# Altium integrated library WE-LAN_rev15b.intlib: 35 symbols
Pins are listed as number, name and electrical type; pins without a type are passive.

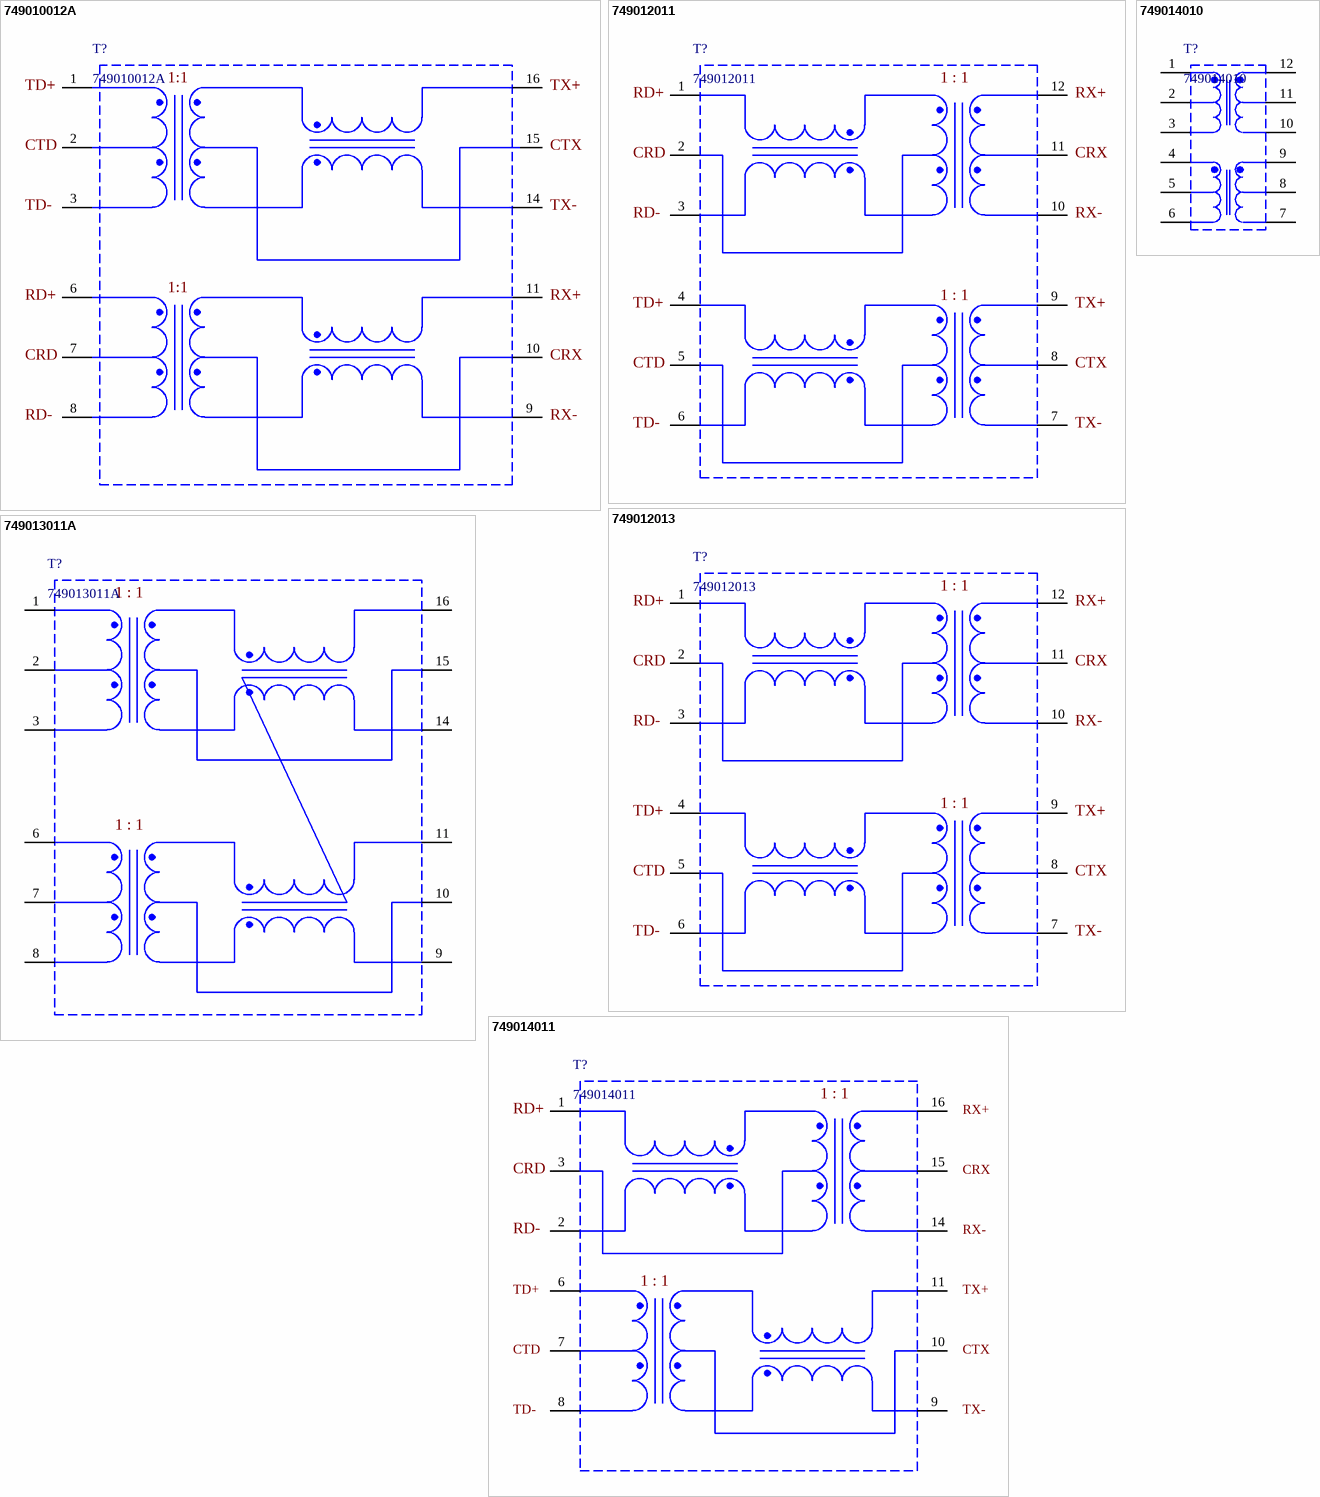
[diagram p0: symbols 749010012A to 749014011]

## 749010012A
designator T?
10/100 Base-T SMD Transformer 1 Port; Manufacturer: Wurth Elektronik; ComponentLink1Description: Manufacturer; ComponentLink1URL: http://www.we-online.com; ComponentLink2Description: Datasheet; ComponentLink2URL: http://katalog.we-online.de/pbs/datasheet/749010012A.pdf; Created by: Baojun Chen; Created Date: 27.Oct.2015; partNo: 749010012A
footprint 749010012A (10/100 Base-T SMD Transformer 1 Port)
pins: 1 TD+, 2 CTD, 3 TD-, 6 RD+, 7 CRD, 8 RD-, 9 RX-, 10 CRX, 11 RX+, 14 TX-, 15 CTX, 16 TX+
text: 1:1

## 749012011
designator T?
10/100/1000 Base-T PoE/PoE+; Manufacturer: Wurth Elektronik; ComponentLink1Description: Manufacturer; ComponentLink1URL: http://www.we-online.com; ComponentLink2Description: Datasheet; ComponentLink2URL: http://katalog.we-online.de/pbs/datasheet/749012011.pdf; Created by: Baojun Chen; Created Date: 28.Oct.2015; partNo: 749012011
footprint 749012011 (10/100/1000 Base-T PoE/PoE+)
pins: 1 RD+, 2 CRD, 3 RD-, 4 TD+, 5 CTD, 6 TD-, 7 TX-, 8 CTX, 9 TX+, 10 RX-, 11 CRX, 12 RX+
text: 1 : 1

## 749012013
designator T?
10/100/1000 Base-T PoE/PoE+; Manufacturer: Wurth Elektronik; ComponentLink1Description: Manufacturer; ComponentLink1URL: http://www.we-online.com; ComponentLink2Description: Datasheet; ComponentLink2URL: http://katalog.we-online.de/pbs/datasheet/749012013.pdf; Created by: Baojun Chen; Created Date: 28.Oct.2015; partNo: 749012013
footprint 749012013 (10/100/1000 Base-T PoE/PoE+)
pins: 1 RD+, 2 CRD, 3 RD-, 4 TD+, 5 CTD, 6 TD-, 7 TX-, 8 CTX, 9 TX+, 10 RX-, 11 CRX, 12 RX+
text: 1 : 1

## 749013011A
designator T?
10/100/1000 Base-T PoE/PoE+; Manufacturer: Wurth Elektronik; ComponentLink1Description: Manufacturer; ComponentLink1URL: http://www.we-online.com; ComponentLink2Description: Datasheet; ComponentLink2URL: http://katalog.we-online.de/pbs/datasheet/749013011A.pdf; Created by: Baojun Chen; Created Date: 28.Oct.2015; partNo: 749013011A
footprint 749013011A (10/100/1000 Base-T PoE/PoE+)
pins: 1, 2, 3, 6, 7, 8, 9, 10, 11, 14, 15, 16
text: 1 : 1

## 749014010
designator T?
10/100/1000 Base-T High Voltage; Manufacturer: Wurth Elektronik; ComponentLink1Description: Manufacturer; ComponentLink1URL: http://www.we-online.com; ComponentLink2Description: Datasheet; ComponentLink2URL: http://katalog.we-online.de/pbs/datasheet/749014010.pdf; Created by: Baojun Chen; Created Date: 28.Oct.2015; partNo: 749014010
footprint 749014010 (10/100/1000 Base-T High Voltage)
pins: 1, 2, 3, 4, 5, 6, 7, 8, 9, 10, 11, 12

## 749014011
designator T?
10/100/1000 Base-T High Voltage; Manufacturer: Wurth Elektronik; ComponentLink1Description: Manufacturer; ComponentLink1URL: http://www.we-online.com; ComponentLink2Description: Datasheet; ComponentLink2URL: http://katalog.we-online.de/pbs/datasheet/749014011.pdf; Created by: Baojun Chen; Created Date: 30.Oct.2015; partNo: 749014011
footprint 749014011 (10/100/1000 Base-T High Voltage)
pins: 1 RD+, 2 RD-, 3 CRD, 6 TD+, 7 CTD, 8 TD-, 9 TX-, 10 CTX, 11 TX+, 14 RX-, 15 CRX, 16 RX+
text: 1 : 1

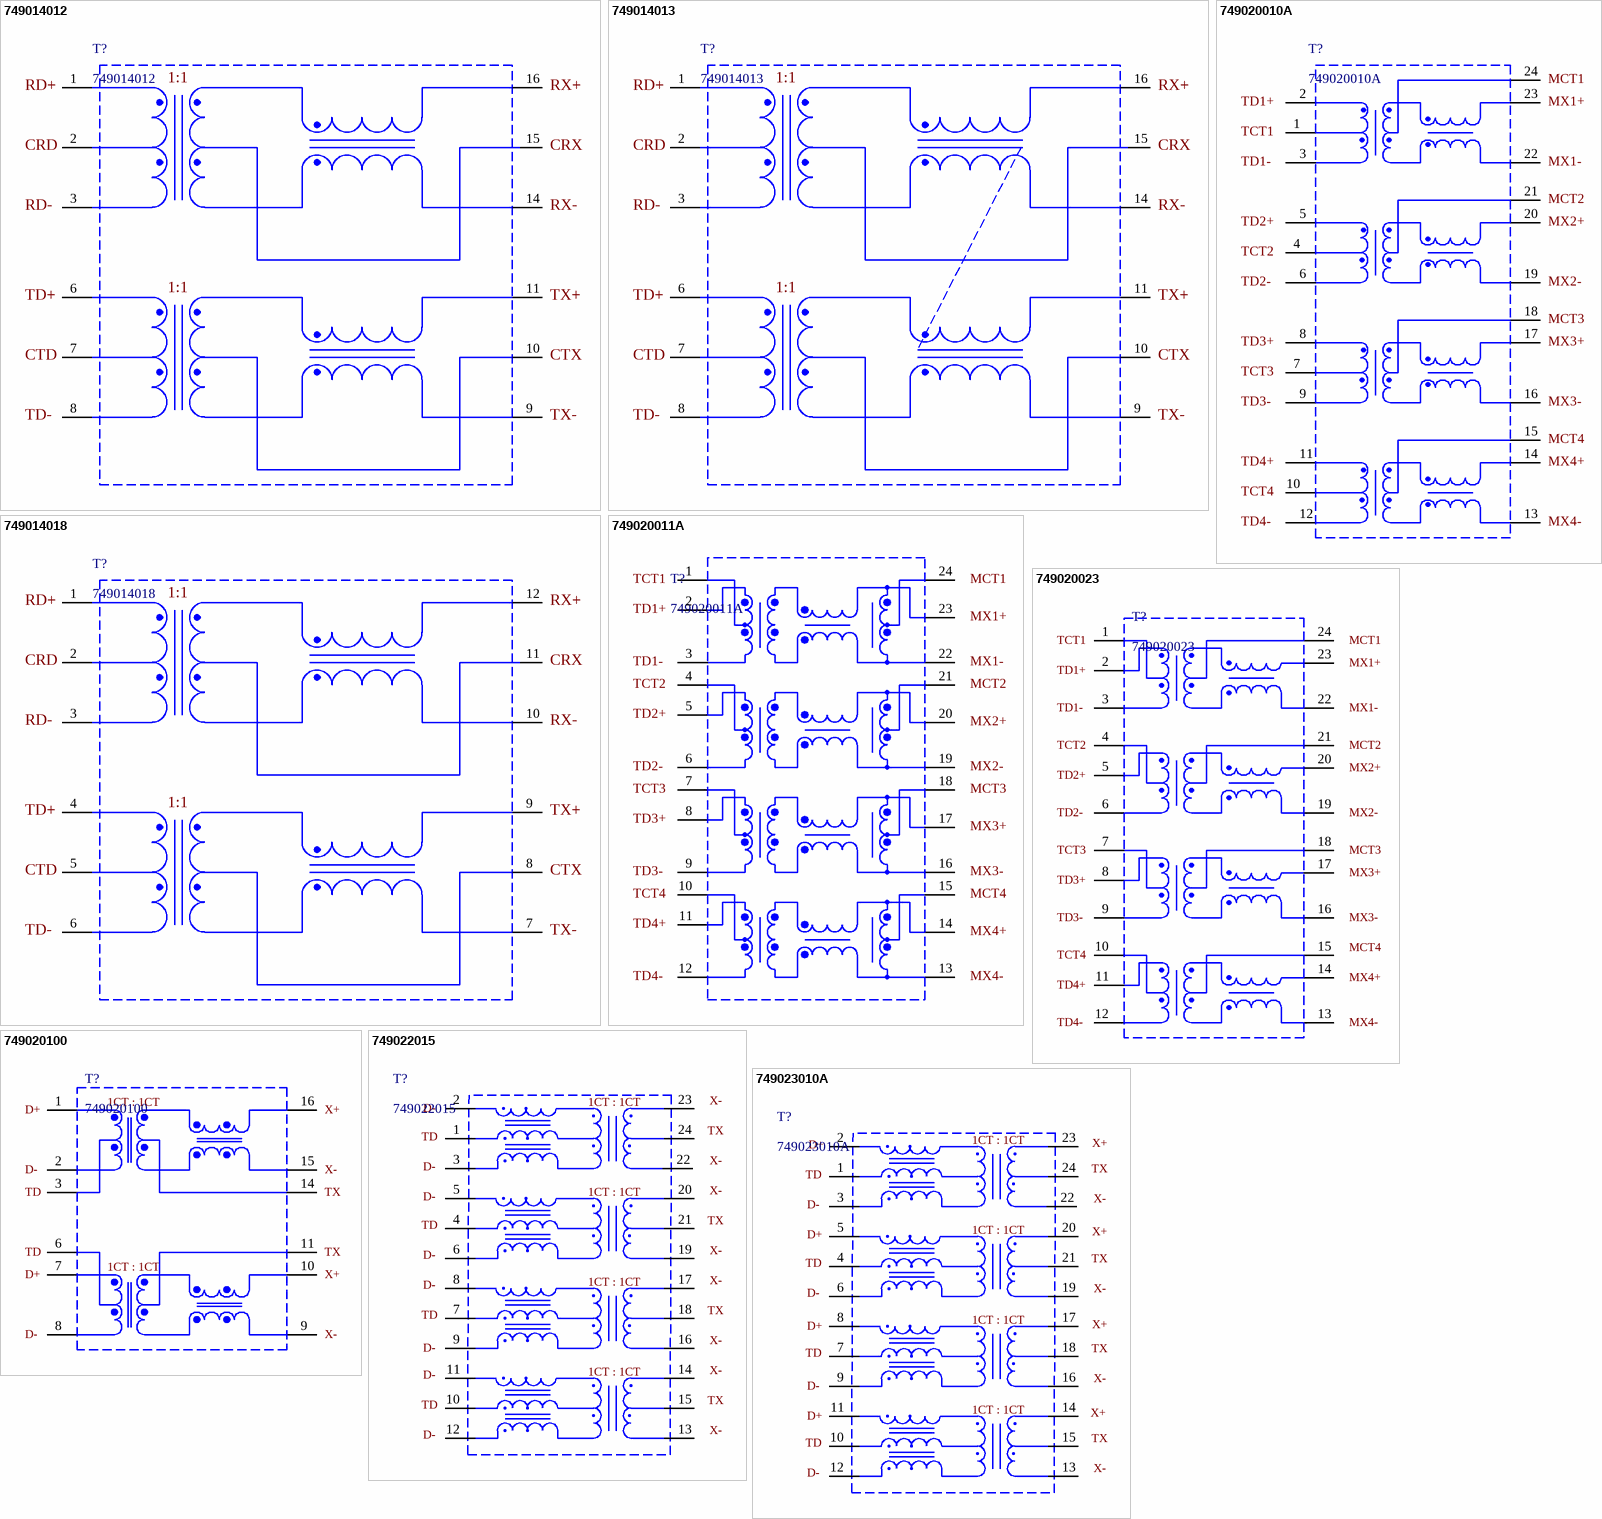
[diagram p1: symbols 749014012 to 749023010A]

## 749014012
designator T?
10/100/1000 Base-T High Voltage; Manufacturer: Wurth Elektronik; ComponentLink1Description: Manufacturer; ComponentLink1URL: http://www.we-online.com; ComponentLink2Description: Datasheet; ComponentLink2URL: http://katalog.we-online.de/pbs/datasheet/749014012.pdf; Created by: Baojun Chen; Created Date: 30.Oct.2015; partNo: 749014012
footprint 749014012 (10/100/1000 Base-T High Voltage)
pins: 1 RD+, 2 CRD, 3 RD-, 6 TD+, 7 CTD, 8 TD-, 9 TX-, 10 CTX, 11 TX+, 14 RX-, 15 CRX, 16 RX+
text: 1:1

## 749014013
designator T?
10/100/1000 Base-T High Voltage; Manufacturer: Wurth Elektronik; ComponentLink1Description: Manufacturer; ComponentLink1URL: http://www.we-online.com; ComponentLink2Description: Datasheet; ComponentLink2URL: http://katalog.we-online.de/pbs/datasheet/749014013.pdf; Created by: Baojun Chen; Created Date: 30.Oct.2015; partNo: 749014013
footprint 749014013 (10/100/1000 Base-T High Voltage)
pins: 1 RD+, 2 CRD, 3 RD-, 6 TD+, 7 CTD, 8 TD-, 9 TX-, 10 CTX, 11 TX+, 14 RX-, 15 CRX, 16 RX+
text: 1:1

## 749014018
designator T?
10/100/1000 Base-T High Voltage; Manufacturer: Wurth Elektronik; ComponentLink1Description: Manufacturer; ComponentLink1URL: http://www.we-online.com; ComponentLink2Description: Datasheet; ComponentLink2URL: http://katalog.we-online.de/pbs/datasheet/749014018.pdf; Created by: Baojun Chen; Created Date: 30.Oct.2015; partNo: 749014018
footprint 749014018 (10/100/1000 Base-T High Voltage)
pins: 1 RD+, 2 CRD, 3 RD-, 4 TD+, 5 CTD, 6 TD-, 7 TX-, 8 CTX, 9 TX+, 10 RX-, 11 CRX, 12 RX+
text: 1:1

## 749020010A
designator T?
10/100/1000 Base-T; Manufacturer: Wurth Elektronik; ComponentLink1Description: Manufacturer; ComponentLink1URL: http://www.we-online.com; ComponentLink2Description: Datasheet; ComponentLink2URL: http://katalog.we-online.de/pbs/datasheet/749020010A.pdf; Created by: Baojun Chen; Created Date: 31.Oct.2015; partNo: 749020010A
footprint 749020010A (10/100/1000 Base-T)
pins: 1 TCT1, 2 TD1+, 3 TD1-, 4 TCT2, 5 TD2+, 6 TD2-, 7 TCT3, 8 TD3+, 9 TD3-, 10 TCT4, 11 TD4+, 12 TD4-, 13 MX4-, 14 MX4+, 15 MCT4, 16 MX3-, 17 MX3+, 18 MCT3, 19 MX2-, 20 MX2+, 21 MCT2, 22 MX1-, 23 MX1+, 24 MCT1

## 749020011A
designator T?
10/100/1000 Base-T; Manufacturer: Wurth Elektronik; ComponentLink1Description: Manufacturer; ComponentLink1URL: http://www.we-online.com; ComponentLink2Description: Datasheet; ComponentLink2URL: http://katalog.we-online.de/pbs/datasheet/749020011A.pdf; Created by: Baojun Chen; Created Date: 31.Oct.2015; partNo: 749020011A
footprint 749020011A (10/100/1000 Base-T)
pins: 1 TCT1, 2 TD1+, 3 TD1-, 4 TCT2, 5 TD2+, 6 TD2-, 7 TCT3, 8 TD3+, 9 TD3-, 10 TCT4, 11 TD4+, 12 TD4-, 13 MX4-, 14 MX4+, 15 MCT4, 16 MX3-, 17 MX3+, 18 MCT3, 19 MX2-, 20 MX2+, 21 MCT2, 22 MX1-, 23 MX1+, 24 MCT1

## 749020023
designator T?
10/100/1000 Base-T; Manufacturer: Wurth Elektronik; ComponentLink1Description: Manufacturer; ComponentLink1URL: http://www.we-online.com; ComponentLink2Description: Datasheet; ComponentLink2URL: http://katalog.we-online.de/pbs/datasheet/749020023.pdf; Created by: Baojun Chen; Created Date: 3.Nov.2015; partNo: 749020023
footprint 749020023 (10/100/1000 Base-T)
pins: 1 TCT1, 2 TD1+, 3 TD1-, 4 TCT2, 5 TD2+, 6 TD2-, 7 TCT3, 8 TD3+, 9 TD3-, 10 TCT4, 11 TD4+, 12 TD4-, 13 MX4-, 14 MX4+, 15 MCT4, 16 MX3-, 17 MX3+, 18 MCT3, 19 MX2-, 20 MX2+, 21 MCT2, 22 MX1-, 23 MX1+, 24 MCT1

## 749020100
designator T?
10/100/1000 Base-T; Manufacturer: Wurth Elektronik; ComponentLink2URL: http://katalog.we-online.de/pbs/datasheet/749020100.pdf; Created by: Baojun Chen; Created Date: 3.Nov.2015; partNo: 749020100; ComponentLink1Description: Manufacturer; ComponentLink1URL: http://www.we-online.com; ComponentLink2Description: Datasheet
footprint 749020100 (10/100/1000 Base-T)
pins: 1 D+, 2 D-, 3 TD, 6 TD, 7 D+, 8 D-, 9 X-, 10 X+, 11 TX, 14 TX, 15 X-, 16 X+
text: 1CT : 1CT

## 749022015
designator T?
10/100/1000 Base-T PoE/PoE+; Manufacturer: Wurth Elektronik; Created by: Baojun Chen; Created Date: 4.Nov..2015; partNo: 749022015; ComponentLink1Description: Manufacturer; ComponentLink1URL: http://www.we-online.com; ComponentLink2Description: Datasheet
footprint 749022015 (10/100/1000 Base-T PoE/PoE+)
pins: 1 TD, 2 D-, 3 D-, 4 TD, 5 D-, 6 D-, 7 TD, 8 D-, 9 D-, 10 TD, 11 D-, 12 D-, 13 X-, 14 X-, 15 TX, 16 X-, 17 X-, 18 TX, 19 X-, 20 X-, 21 TX, 22 X-, 23 X-, 24 TX
text: 1CT : 1CT

## 749023010A
designator T?
10/100/1000 Base-T PoE/PoE+; Manufacturer: Wurth Elektronik; ComponentLink2URL: http://katalog.we-online.de/pbs/datasheet/749023010A.pdf; Created by: Baojun Chen; Created Date: 4.Nov..2015; partNo: 749023010A; ComponentLink1Description: Manufacturer; ComponentLink1URL: http://www.we-online.com; ComponentLink2Description: Datasheet
footprint 749023010A (10/100/1000 Base-T PoE/PoE+)
pins: 1 TD, 2 D+, 3 D-, 4 TD, 5 D+, 6 D-, 7 TD, 8 D+, 9 D-, 10 TD, 11 D+, 12 D-, 13 X-, 14 X+, 15 TX, 16 X-, 17 X+, 18 TX, 19 X-, 20 X+, 21 TX, 22 X-, 23 X+, 24 TX
text: 1CT : 1CT

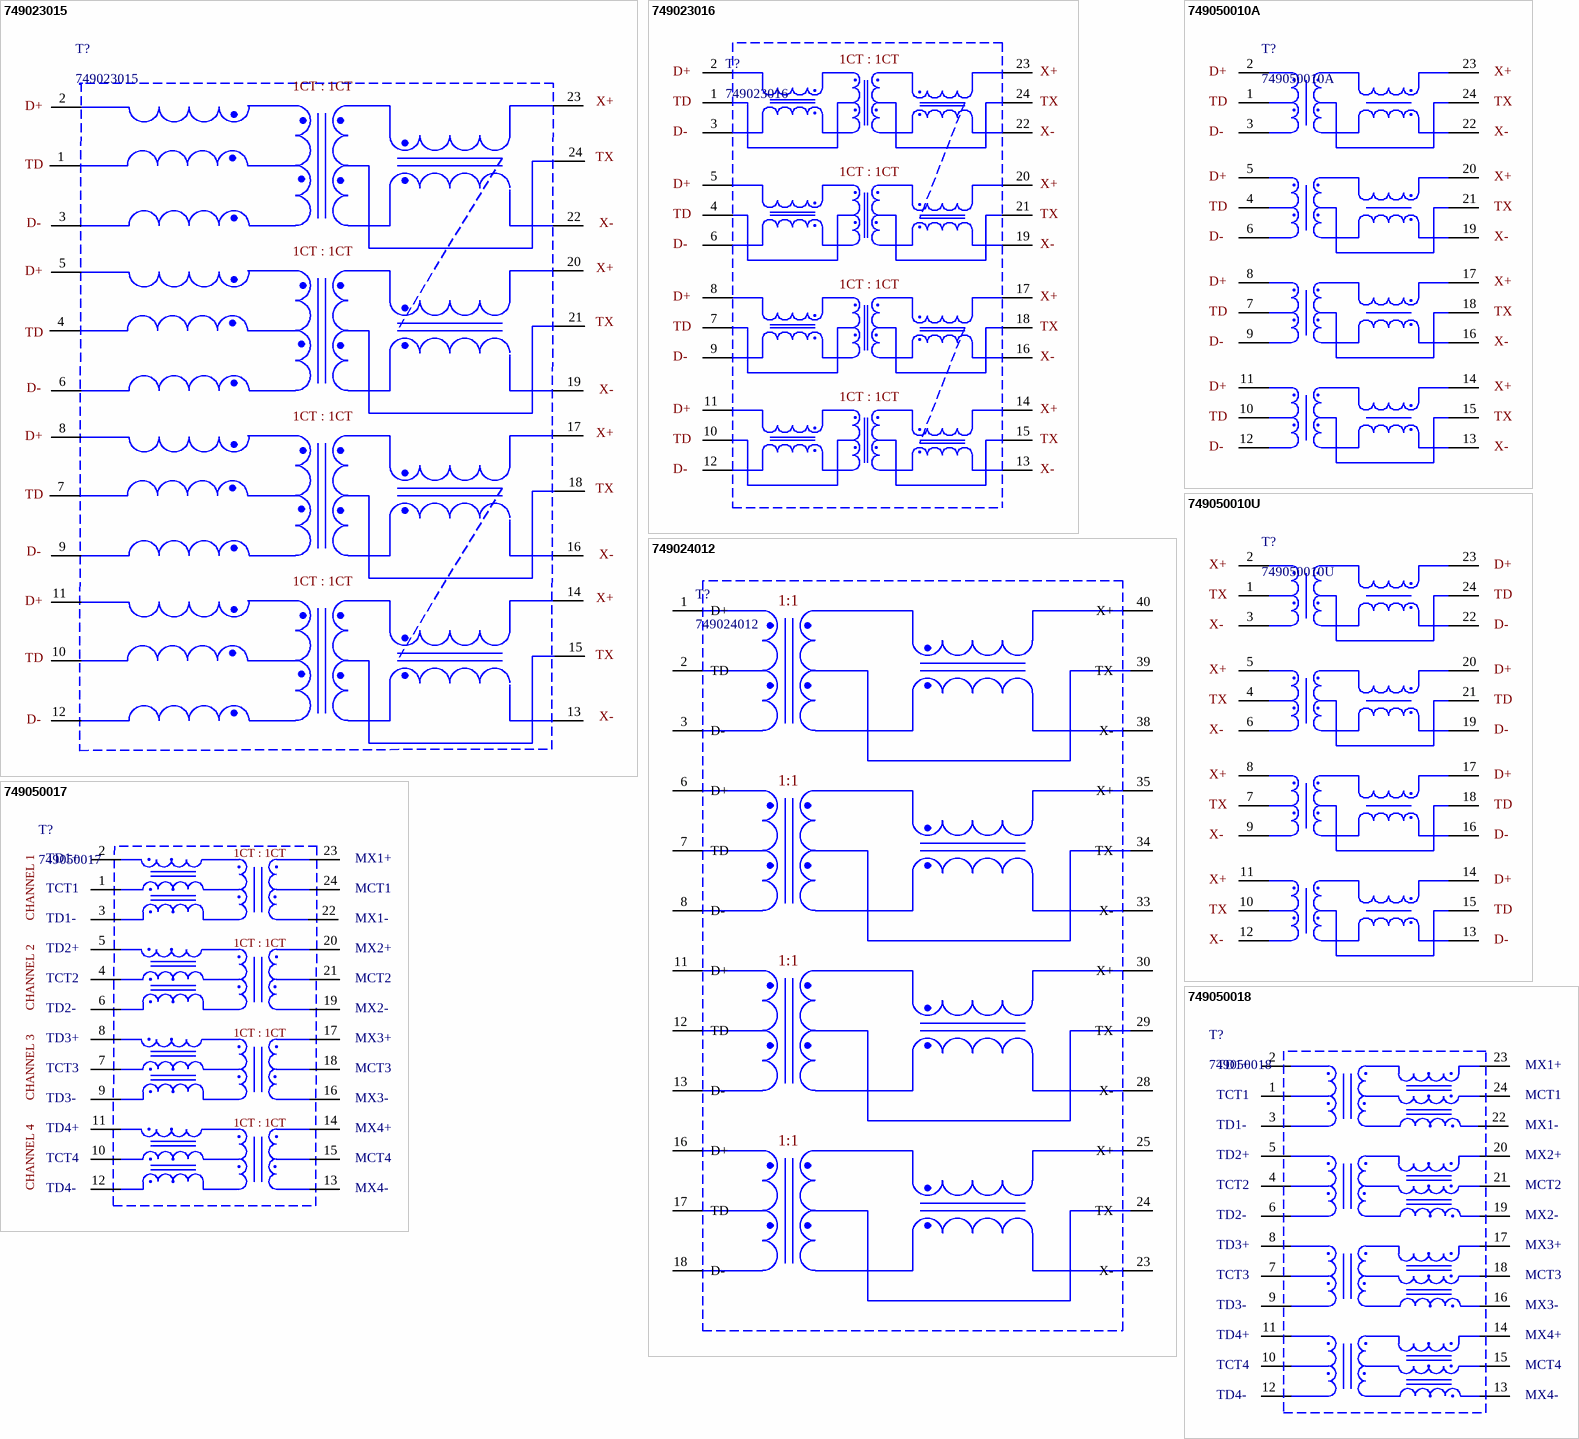
[diagram p2: symbols 749023015 to 749050018]

## 749023015
designator T?
1000 Base-T High Performance Low EMI; Manufacturer: Wurth Elektronik; ComponentLink1Description: Manufacturer; ComponentLink1URL: http://www.we-online.com; ComponentLink2Description: Datasheet; ComponentLink2URL: http://katalog.we-online.de/pbs/datasheet/749023015.pdf; Created by: Baojun Chen; Created Date: 4.Nov.2015; partNo: 749023015
footprint 749023015 (1000 Base-T High Performance Low EMI)
pins: 1 TD, 2 D+, 3 D-, 4 TD, 5 D+, 6 D-, 7 TD, 8 D+, 9 D-, 10 TD, 11 D+, 12 D-, 13 X-, 14 X+, 15 TX, 16 X-, 17 X+, 18 TX, 19 X-, 20 X+, 21 TX, 22 X-, 23 X+, 24 TX
text: 1CT : 1CT

## 749023016
designator T?
1000 Base-T High Performance Low EMI; Manufacturer: Wurth Elektronik; ComponentLink1Description: Manufacturer; ComponentLink1URL: http://www.we-online.com; ComponentLink2Description: Datasheet; ComponentLink2URL: http://katalog.we-online.de/pbs/datasheet/749023016.pdf; Created by: Baojun Chen; Created Date: 4.Nov.2015; partNo: 749023016
footprint 749023016 (1000 Base-T High Performance Low EMI)
pins: 1 TD, 2 D+, 3 D-, 4 TD, 5 D+, 6 D-, 7 TD, 8 D+, 9 D-, 10 TD, 11 D+, 12 D-, 13 X-, 14 X+, 15 TX, 16 X-, 17 X+, 18 TX, 19 X-, 20 X+, 21 TX, 22 X-, 23 X+, 24 TX
text: 1CT : 1CT

## 749024012
designator T?
10/100/1000 Base-T SMD Transformer 1 Port; Manufacturer: Wurth Elektronik; ComponentLink1Description: Manufacturer; ComponentLink1URL: http://www.we-online.com; ComponentLink2Description: Datasheet; ComponentLink2URL: http://katalog.we-online.de/pbs/datasheet/749024012.pdf; Created by: Baojun Chen; Created Date: Feb.2016; partNo: 749024012
footprint 749024012 (WE-LAN LAN Transformer)
pins: 1 D+, 2 TD, 3 D-, 6 D+, 7 TD, 8 D-, 11 D+, 12 TD, 13 D-, 16 D+, 17 TD, 18 D-, 23 X-, 24 TX, 25 X+, 28 X-, 29 TX, 30 X+, 33 X-, 34 TX, 35 X+, 38 X-, 39 TX, 40 X+
text: 1:1

## 749050010A
designator T?
10Gbit Base-T; Manufacturer: Wurth Elektronik; ComponentLink1Description: Manufacturer; ComponentLink1URL: http://www.we-online.com; ComponentLink2Description: Datasheet; ComponentLink2URL: http://katalog.we-online.de/pbs/datasheet/749050010A.pdf; Created by: Baojun Chen; Created Date: 4.Nov..2015; partNo: 749050010A
footprint 749050010A (10Gbit Base-T)
pins: 1 TD, 2 D+, 3 D-, 4 TD, 5 D+, 6 D-, 7 TD, 8 D+, 9 D-, 10 TD, 11 D+, 12 D-, 13 X-, 14 X+, 15 TX, 16 X-, 17 X+, 18 TX, 19 X-, 20 X+, 21 TX, 22 X-, 23 X+, 24 TX

## 749050010U
designator T?
10Gbit Base-T; Manufacturer: Wurth Elektronik; ComponentLink1Description: Manufacturer; ComponentLink1URL: http://www.we-online.com; ComponentLink2Description: Datasheet; ComponentLink2URL: http://katalog.we-online.de/pbs/datasheet/749050010U.pdf; Created by: Baojun Chen; Created Date: 4.Nov..2015; partNo: 749050010U
footprint 749050010U (10Gbit Base-T)
pins: 1 TX, 2 X+, 3 X-, 4 TX, 5 X+, 6 X-, 7 TX, 8 X+, 9 X-, 10 TX, 11 X+, 12 X-, 13 D-, 14 D+, 15 TD, 16 D-, 17 D+, 18 TD, 19 D-, 20 D+, 21 TD, 22 D-, 23 D+, 24 TD

## 749050017
designator T?
10G Base-T SMD Transformer 1 Port; Manufacturer: Wurth Elektronik; Created by: Baojun Chen; Created Date: 24.Oct.2015; partNo: 749050017; ComponentLink1Description: Manufacturer; ComponentLink1URL: http://www.we-online.com; ComponentLink2Description: Datasheet
footprint 749050017 (10G Base-T SMD Transformer 1 Port)
pins: 1 TCT1, 2 TD1+, 3 TD1-, 4 TCT2, 5 TD2+, 6 TD2-, 7 TCT3, 8 TD3+, 9 TD3-, 10 TCT4, 11 TD4+, 12 TD4-, 13 MX4-, 14 MX4+, 15 MCT4, 16 MX3-, 17 MX3+, 18 MCT3, 19 MX2-, 20 MX2+, 21 MCT2, 22 MX1-, 23 MX1+, 24 MCT1
text: 1CT : 1CT; CHANNEL 1; CHANNEL 2; CHANNEL 3; CHANNEL 4

## 749050018
designator T?
10G Base-T SMD Transformer 1 Port; Manufacturer: Wurth Elektronik; ComponentLink1Description: Manufacturer; ComponentLink1URL: http://www.we-online.com; ComponentLink2Description: Datasheet; Created by: Baojun Chen; Created Date: 24.Oct.2015; partNo: 749050018
footprint 749050018 (WE-LAN Transformer 10G)
pins: 1 TCT1, 2 TD1+, 3 TD1-, 4 TCT2, 5 TD2+, 6 TD2-, 7 TCT3, 8 TD3+, 9 TD3-, 10 TCT4, 11 TD4+, 12 TD4-, 13 MX4-, 14 MX4+, 15 MCT4, 16 MX3-, 17 MX3+, 18 MCT3, 19 MX2-, 20 MX2+, 21 MCT2, 22 MX1-, 23 MX1+, 24 MCT1

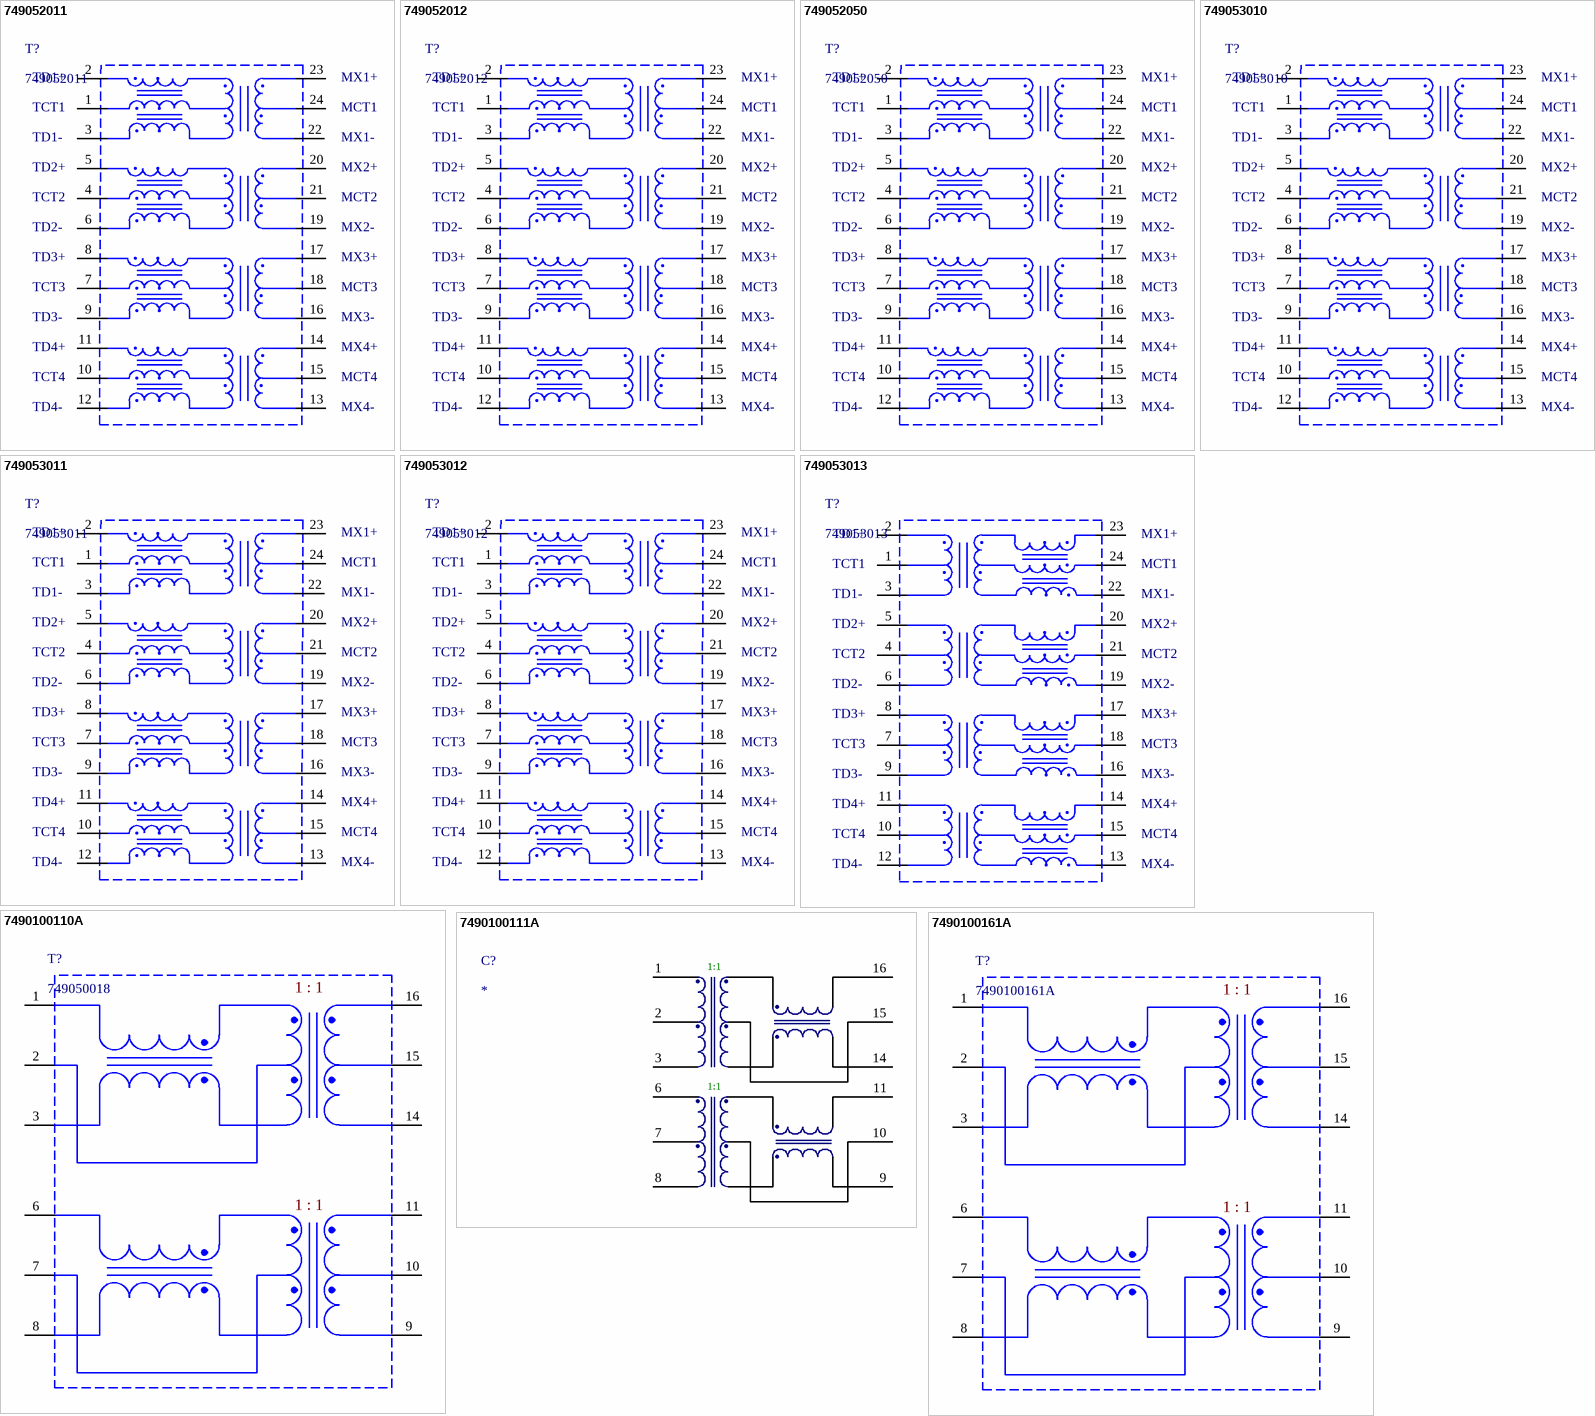
[diagram p3: symbols 749052011 to 7490100161A]

## 749052011
designator T?
10G Base-T SMD Transformer 1 Port; Manufacturer: Wurth Elektronik; Created by: Baojun Chen; Created Date: 24.Oct.2015; partNo: 749052011; ComponentLink1Description: Manufacturer; ComponentLink1URL: http://www.we-online.com; ComponentLink2Description: Datasheet
footprint 749052011 (WE-LAN Transformer 10G)
pins: 1 TCT1, 2 TD1+, 3 TD1-, 4 TCT2, 5 TD2+, 6 TD2-, 7 TCT3, 8 TD3+, 9 TD3-, 10 TCT4, 11 TD4+, 12 TD4-, 13 MX4-, 14 MX4+, 15 MCT4, 16 MX3-, 17 MX3+, 18 MCT3, 19 MX2-, 20 MX2+, 21 MCT2, 22 MX1-, 23 MX1+, 24 MCT1

## 749052012
designator T?
10G Base-T SMD Transformer 1 Port; Manufacturer: Wurth Elektronik; Created by: Baojun Chen; Created Date: 24.Oct.2015; partNo: 749052012; ComponentLink1Description: Manufacturer; ComponentLink1URL: http://www.we-online.com; ComponentLink2Description: Datasheet
footprint 749052012 (WE-LAN Transformer 10G)
pins: 1 TCT1, 2 TD1+, 3 TD1-, 4 TCT2, 5 TD2+, 6 TD2-, 7 TCT3, 8 TD3+, 9 TD3-, 10 TCT4, 11 TD4+, 12 TD4-, 13 MX4-, 14 MX4+, 15 MCT4, 16 MX3-, 17 MX3+, 18 MCT3, 19 MX2-, 20 MX2+, 21 MCT2, 22 MX1-, 23 MX1+, 24 MCT1

## 749052050
designator T?
10G Base-T SMD Transformer 1 Port; Manufacturer: Wurth Elektronik; Created by: Baojun Chen; Created Date: 24.Oct.2015; partNo: 749052050; ComponentLink1Description: Manufacturer; ComponentLink1URL: http://www.we-online.com; ComponentLink2Description: Datasheet
footprint 749052050 (WE-LAN Transformer 10G)
pins: 1 TCT1, 2 TD1+, 3 TD1-, 4 TCT2, 5 TD2+, 6 TD2-, 7 TCT3, 8 TD3+, 9 TD3-, 10 TCT4, 11 TD4+, 12 TD4-, 13 MX4-, 14 MX4+, 15 MCT4, 16 MX3-, 17 MX3+, 18 MCT3, 19 MX2-, 20 MX2+, 21 MCT2, 22 MX1-, 23 MX1+, 24 MCT1

## 749053010
designator T?
10G Base-T SMD Transformer 1 Port; Manufacturer: Wurth Elektronik; Created by: Baojun Chen; Created Date: 24.Oct.2015; partNo: 749053010; ComponentLink1Description: Manufacturer; ComponentLink1URL: http://www.we-online.com; ComponentLink2Description: Datasheet
footprint 749053010 (WE-LAN Transformer 10G)
pins: 1 TCT1, 2 TD1+, 3 TD1-, 4 TCT2, 5 TD2+, 6 TD2-, 7 TCT3, 8 TD3+, 9 TD3-, 10 TCT4, 11 TD4+, 12 TD4-, 13 MX4-, 14 MX4+, 15 MCT4, 16 MX3-, 17 MX3+, 18 MCT3, 19 MX2-, 20 MX2+, 21 MCT2, 22 MX1-, 23 MX1+, 24 MCT1

## 749053011
designator T?
10G Base-T SMD Transformer 1 Port; Manufacturer: Wurth Elektronik; Created by: Baojun Chen; Created Date: 24.Oct.2015; partNo: 749053011; ComponentLink1Description: Manufacturer; ComponentLink1URL: http://www.we-online.com; ComponentLink2Description: Datasheet
footprint 749053011 (WE-LAN Transformer 10G)
pins: 1 TCT1, 2 TD1+, 3 TD1-, 4 TCT2, 5 TD2+, 6 TD2-, 7 TCT3, 8 TD3+, 9 TD3-, 10 TCT4, 11 TD4+, 12 TD4-, 13 MX4-, 14 MX4+, 15 MCT4, 16 MX3-, 17 MX3+, 18 MCT3, 19 MX2-, 20 MX2+, 21 MCT2, 22 MX1-, 23 MX1+, 24 MCT1

## 749053012
designator T?
10G Base-T SMD Transformer 1 Port; Manufacturer: Wurth Elektronik; Created by: Baojun Chen; Created Date: 3.Nov.2015; partNo: 749053012; ComponentLink1Description: Manufacturer; ComponentLink1URL: http://www.we-online.com; ComponentLink2Description: Datasheet
footprint 749053012 (10G Base-T SMD Transformer 1 Port)
pins: 1 TCT1, 2 TD1+, 3 TD1-, 4 TCT2, 5 TD2+, 6 TD2-, 7 TCT3, 8 TD3+, 9 TD3-, 10 TCT4, 11 TD4+, 12 TD4-, 13 MX4-, 14 MX4+, 15 MCT4, 16 MX3-, 17 MX3+, 18 MCT3, 19 MX2-, 20 MX2+, 21 MCT2, 22 MX1-, 23 MX1+, 24 MCT1

## 749053013
designator T?
10G Base-T SMD Transformer 1 Port; Manufacturer: Wurth Elektronik; ComponentLink1Description: Manufacturer; ComponentLink1URL: http://www.we-online.com; ComponentLink2Description: Datasheet; Created by: Baojun Chen; Created Date: 24.Oct.2015; partNo: 749053013
footprint 749053013 (WE-LAN Transformer 10G)
pins: 1 TCT1, 2 TD1+, 3 TD1-, 4 TCT2, 5 TD2+, 6 TD2-, 7 TCT3, 8 TD3+, 9 TD3-, 10 TCT4, 11 TD4+, 12 TD4-, 13 MX4-, 14 MX4+, 15 MCT4, 16 MX3-, 17 MX3+, 18 MCT3, 19 MX2-, 20 MX2+, 21 MCT2, 22 MX1-, 23 MX1+, 24 MCT1

## 7490100110A
designator T?, comment 749050018
10/100 Base-T SMD Transformer 1 Port; Manufacturer: Wurth Elektronik; ComponentLink1Description: Manufacturer; ComponentLink1URL: http://www.we-online.com; ComponentLink2Description: Datasheet; ComponentLink2URL: http://katalog.we-online.de/pbs/datasheet/7490100110A.pdf; Created by: Baojun Chen; Created Date: 27.Oct.2015; partNo: 749050018
footprint 7490100110A (10/100 Base-T SMD Transformer 1 Port)
pins: 1, 2, 3, 6, 7, 8, 9, 10, 11, 14, 15, 16
text: 1 : 1

## 7490100111A
designator C?
10/100 Base-T SMD Transformer 1 Port WE-LAN,350μH OCL @ 8mA DC bias, IEEE802.3u/ ANSI X3.263, ETR; Manufacturer: Wurth Elektronik; partNo: 7490100111A; E-mail: libraries@we-online.com; ComponentLink1Description: Manufacturer; ComponentLink1URL: http://www.we-online.com; ComponentLink2Description: Datasheet; ComponentLink2URL: http://katalog.we-online.de/pbs/datasheet/7490100111A.pdf; Created by: Karrer Zheng; Created Date: 6/25/2015
footprint 7490100111A (10/100 Base-T SMD Transformer 1 Port WE-LAN ETR)
pins: 1, 2, 3, 6, 7, 8, 9, 10, 11, 14, 15, 16
text: 1:1

## 7490100161A
designator T?
10/100 Base-T SMD Transformer 1 Port; Manufacturer: Wurth Elektronik; ComponentLink1Description: Manufacturer; ComponentLink1URL: http://www.we-online.com; ComponentLink2Description: Datasheet; ComponentLink2URL: http://katalog.we-online.de/pbs/datasheet/7490100161A.pdf; Created by: Baojun Chen; Created Date: 28.Oct.2015; partNo: 7490100161A
footprint 7490100161A (10/100 Base-T SMD Transformer 1 Port)
pins: 1, 2, 3, 6, 7, 8, 9, 10, 11, 14, 15, 16
text: 1 : 1

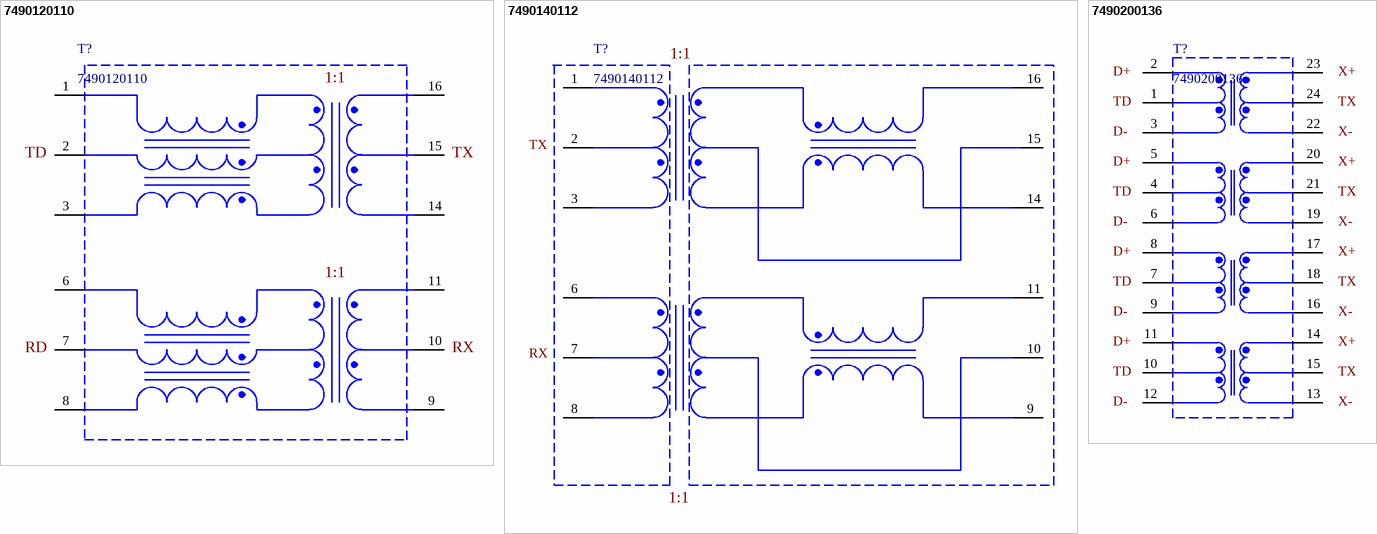
[diagram p4: symbols 7490120110 to 7490200136]

## 7490120110
designator T?
10/100/1000 Base-T PoE/PoE+; Manufacturer: Wurth Elektronik; ComponentLink1Description: Manufacturer; ComponentLink1URL: http://www.we-online.com; ComponentLink2Description: Datasheet; ComponentLink2URL: http://katalog.we-online.de/pbs/datasheet/7490120110.pdf; Created by: Baojun Chen; Created Date: 28.Oct.2015; partNo: 7490120110
footprint 7490120110 (10/100/1000 Base-T PoE/PoE+)
pins: 1, 2, 3, 6, 7, 8, 9, 10, 11, 14, 15, 16
text: 1:1; TD; TX; RD; RX

## 7490140112
designator T?
10/100/1000 Base-T High Voltage; Manufacturer: Wurth Elektronik; ComponentLink1Description: Manufacturer; ComponentLink1URL: http://www.we-online.com; ComponentLink2Description: Datasheet; ComponentLink2URL: http://katalog.we-online.de/pbs/datasheet/7490140112.pdf; Created by: Baojun Chen; Created Date: 30.Oct.2015; partNo: 7490140112
footprint 7490140112 (10/100/1000 Base-T High Voltage)
pins: 1, 2, 3, 6, 7, 8, 9, 10, 11, 14, 15, 16
text: 1:1; TX; RX

## 7490200136
designator T?
10/100/1000 Base-T High Voltage; Manufacturer: Wurth Elektronik; ComponentLink1Description: Manufacturer; ComponentLink1URL: http://www.we-online.com; ComponentLink2Description: Datasheet; ComponentLink2URL: http://katalog.we-online.de/pbs/datasheet/7490200136.pdf; Created by: Baojun Chen; Created Date: 31.Oct.2015; partNo: 7490200136
footprint 7490200136 (10/100/1000 Base-T)
pins: 1 TD, 2 D+, 3 D-, 4 TD, 5 D+, 6 D-, 7 TD, 8 D+, 9 D-, 10 TD, 11 D+, 12 D-, 13 X-, 14 X+, 15 TX, 16 X-, 17 X+, 18 TX, 19 X-, 20 X+, 21 TX, 22 X-, 23 X+, 24 TX